# Altium schematic symbol library FPGA_Xilinx_Virtex6.SchLib: 28 symbols (part 1 of 21)
Pins are listed as number, name and electrical type; pins without a type are passive.

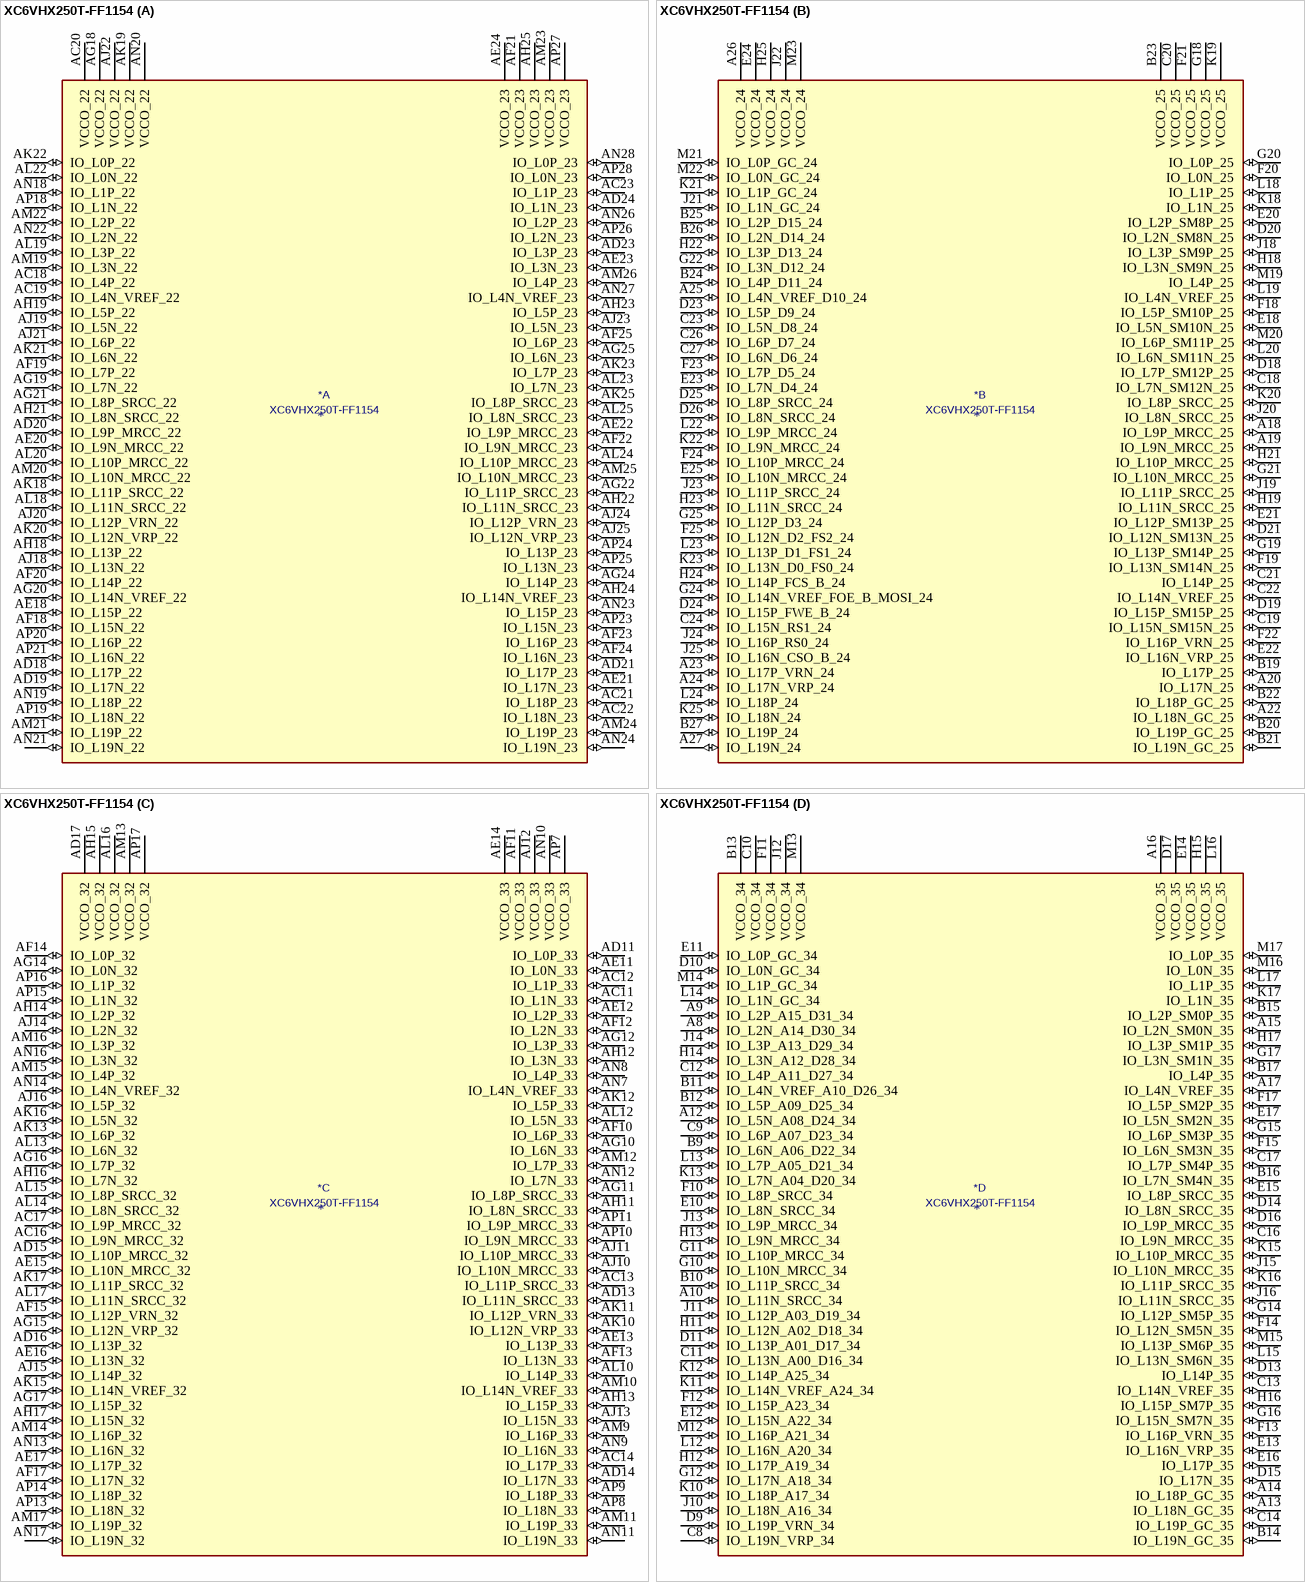
[diagram p0: symbol XC6VHX250T-FF1154]

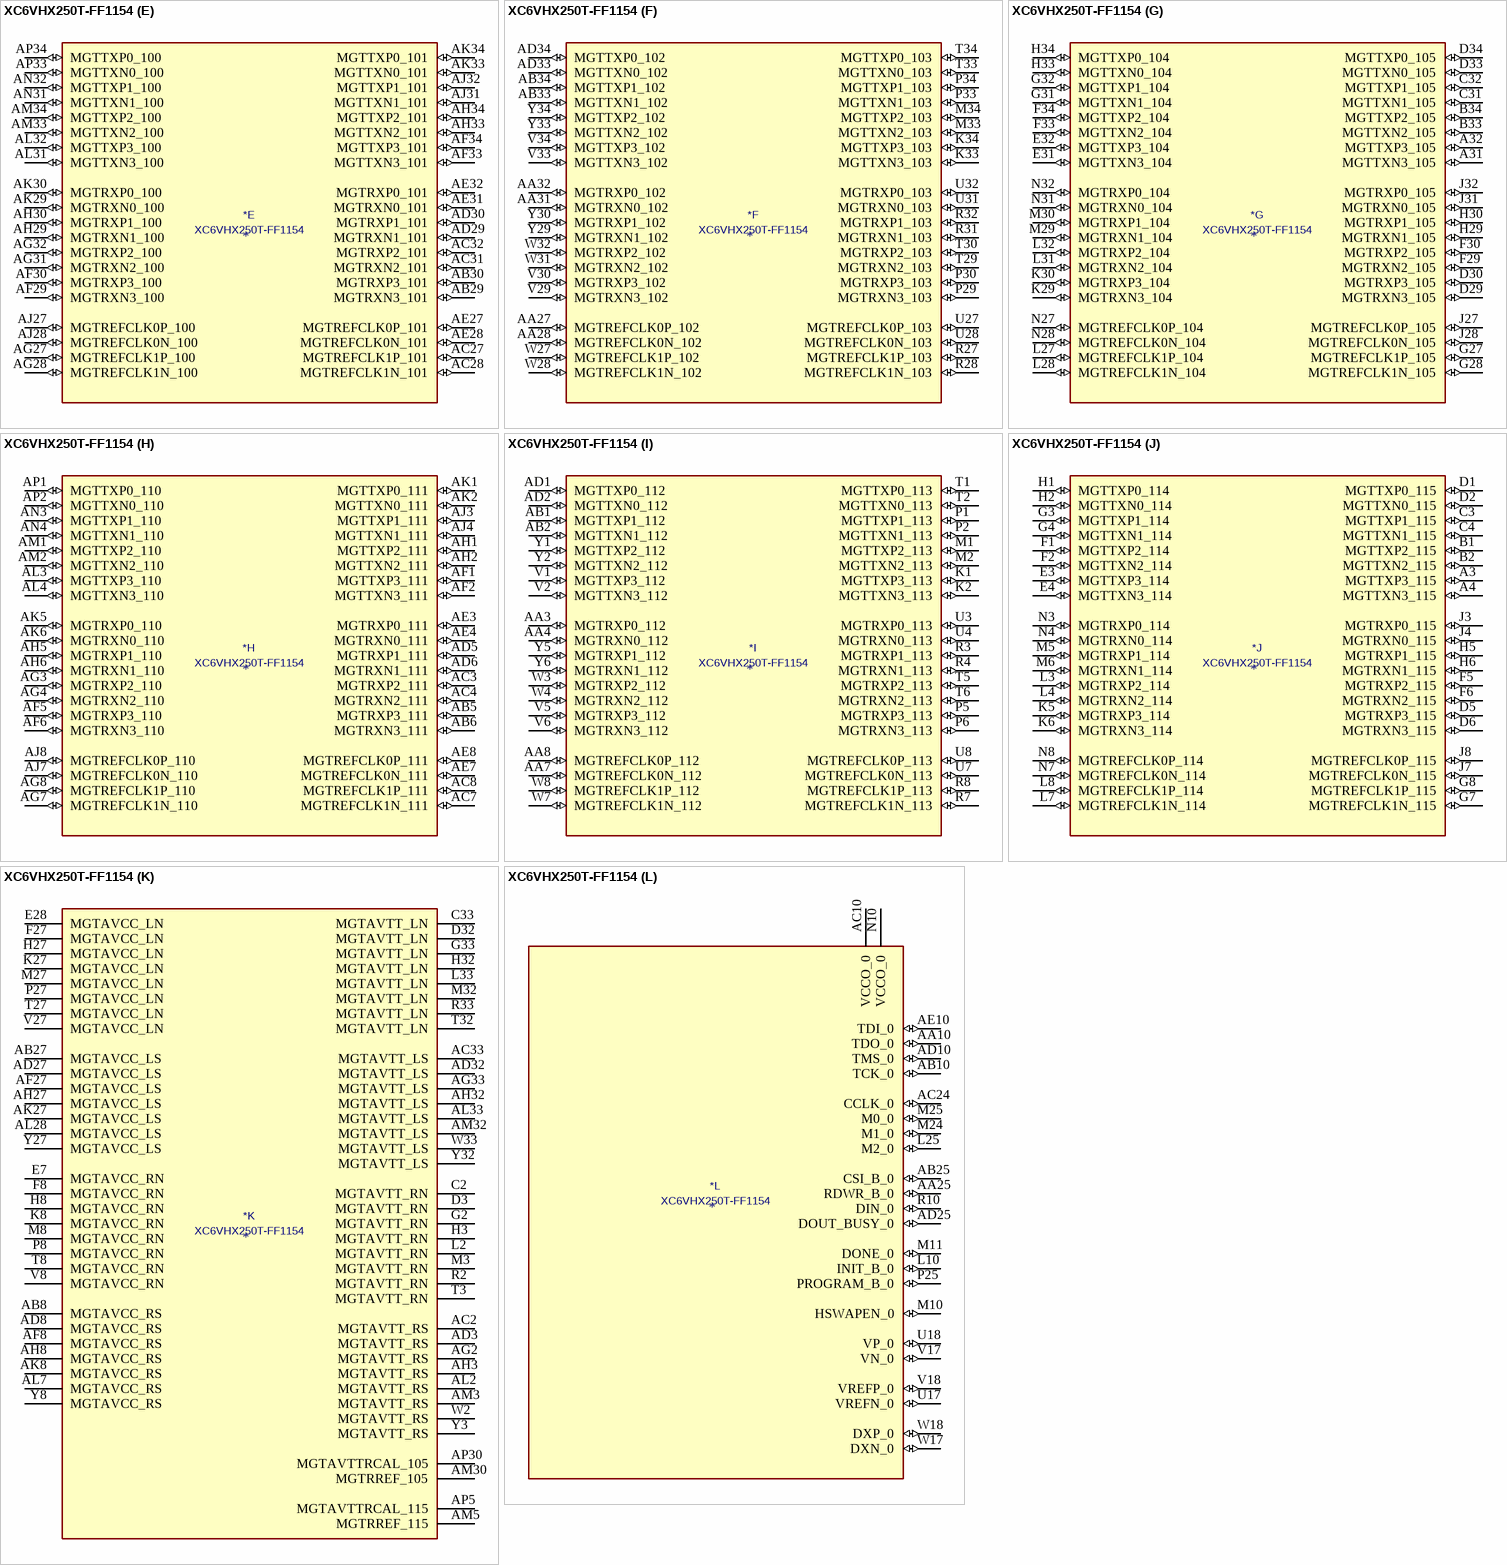
[diagram p1: symbol XC6VHX250T-FF1154]

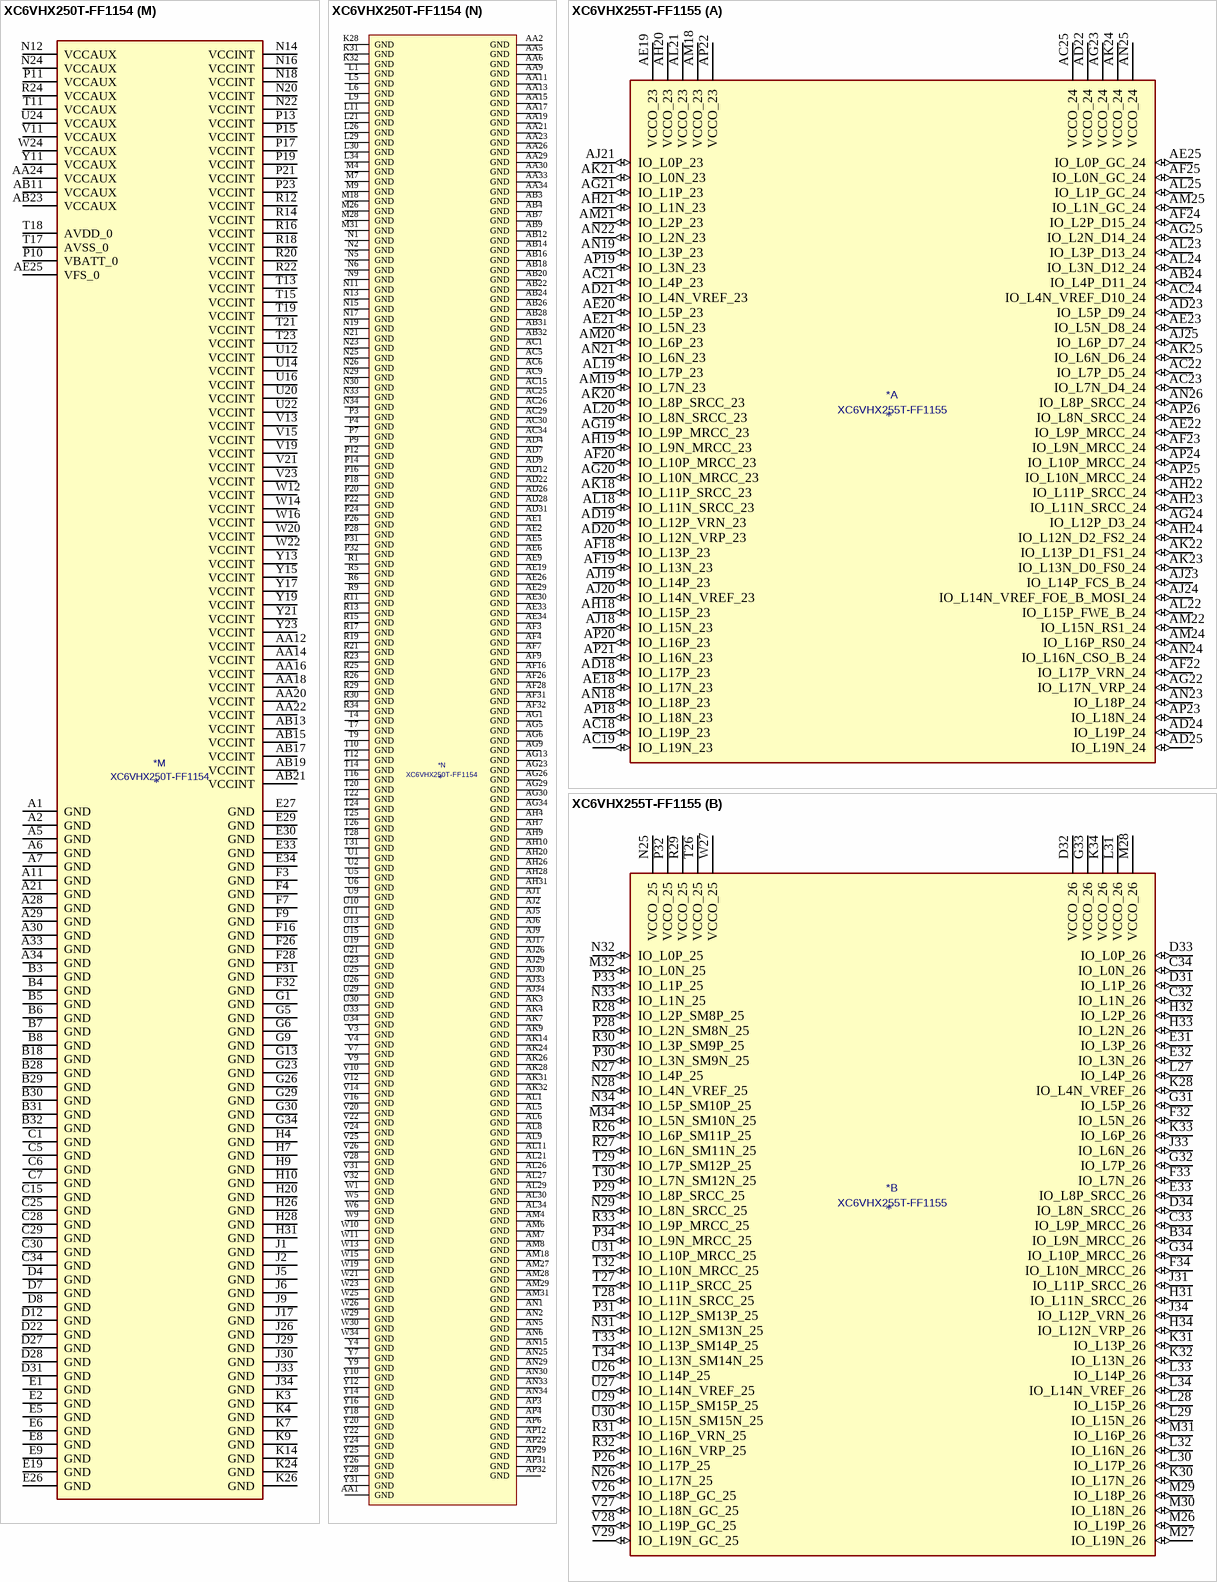
[diagram p2: symbols XC6VHX250T-FF1154 to XC6VHX255T-FF1155]

## XC6VHX250T-FF1154
designator *  value XC6VHX250T-FF1154
ki_keywords: FPGA; ki_description: Virtex 6 HXT 250 XC6VHX250T-FF1154
part A pins: AC18 IO_L4P_22 (io), AC19 IO_L4N_VREF_22 (io), AC20 VCCO_22 (power), AC21 IO_L18P_23 (io), AC22 IO_L18N_23 (io), AC23 IO_L1P_23 (io), AD18 IO_L17P_22 (io), AD19 IO_L17N_22 (io), AD20 IO_L9P_MRCC_22 (io), AD21 IO_L17P_23 (io), AD23 IO_L3P_23 (io), AD24 IO_L1N_23 (io), AE18 IO_L15P_22 (io), AE20 IO_L9N_MRCC_22 (io), AE21 IO_L17N_23 (io), AE22 IO_L9P_MRCC_23 (io), AE23 IO_L3N_23 (io), AE24 VCCO_23 (power), AF18 IO_L15N_22 (io), AF19 IO_L7P_22 (io), AF20 IO_L14P_22 (io), AF21 VCCO_23 (power), AF22 IO_L9N_MRCC_23 (io), AF23 IO_L16P_23 (io), AF24 IO_L16N_23 (io), AF25 IO_L6P_23 (io), AG18 VCCO_22 (power), AG19 IO_L7N_22 (io), AG20 IO_L14N_VREF_22 (io), AG21 IO_L8P_SRCC_22 (io), AG22 IO_L11P_SRCC_23 (io), AG24 IO_L14P_23 (io), AG25 IO_L6N_23 (io), AH18 IO_L13P_22 (io), AH19 IO_L5P_22 (io), AH21 IO_L8N_SRCC_22 (io), AH22 IO_L11N_SRCC_23 (io), AH23 IO_L5P_23 (io), AH24 IO_L14N_VREF_23 (io), AH25 VCCO_23 (power), AJ18 IO_L13N_22 (io), AJ19 IO_L5N_22 (io), AJ20 IO_L12P_VRN_22 (io), AJ21 IO_L6P_22 (io), AJ22 VCCO_22 (power), AJ23 IO_L5N_23 (io), AJ24 IO_L12P_VRN_23 (io), AJ25 IO_L12N_VRP_23 (io), AK18 IO_L11P_SRCC_22 (io), AK19 VCCO_22 (power), AK20 IO_L12N_VRP_22 (io), AK21 IO_L6N_22 (io), AK22 IO_L0P_22 (io), AK23 IO_L7P_23 (io), AK25 IO_L8P_SRCC_23 (io), AL18 IO_L11N_SRCC_22 (io), AL19 IO_L3P_22 (io), AL20 IO_L10P_MRCC_22 (io), AL22 IO_L0N_22 (io), AL23 IO_L7N_23 (io), AL24 IO_L10P_MRCC_23 (io), AL25 IO_L8N_SRCC_23 (io), AM19 IO_L3N_22 (io), AM20 IO_L10N_MRCC_22 (io), AM21 IO_L19P_22 (io), AM22 IO_L2P_22 (io), AM23 VCCO_23 (power), AM24 IO_L19P_23 (io), AM25 IO_L10N_MRCC_23 (io), AM26 IO_L4P_23 (io), AN18 IO_L1P_22 (io), AN19 IO_L18P_22 (io), AN20 VCCO_22 (power), AN21 IO_L19N_22 (io), AN22 IO_L2N_22 (io), AN23 IO_L15P_23 (io), AN24 IO_L19N_23 (io), AN26 IO_L2P_23 (io), AN27 IO_L4N_VREF_23 (io), AN28 IO_L0P_23 (io), AP18 IO_L1N_22 (io), AP19 IO_L18N_22 (io), AP20 IO_L16P_22 (io), AP21 IO_L16N_22 (io), AP23 IO_L15N_23 (io), AP24 IO_L13P_23 (io), AP25 IO_L13N_23 (io), AP26 IO_L2N_23 (io), AP27 VCCO_23 (power), AP28 IO_L0N_23 (io)
part B pins: A18 IO_L9P_MRCC_25 (io), A19 IO_L9N_MRCC_25 (io), A20 IO_L17N_25 (io), A22 IO_L18N_GC_25 (io), A23 IO_L17P_VRN_24 (io), A24 IO_L17N_VRP_24 (io), A25 IO_L4N_VREF_D10_24 (io), A26 VCCO_24 (power), A27 IO_L19N_24 (io), B19 IO_L17P_25 (io), B20 IO_L19P_GC_25 (io), B21 IO_L19N_GC_25 (io), B22 IO_L18P_GC_25 (io), B23 VCCO_25 (power), B24 IO_L4P_D11_24 (io), B25 IO_L2P_D15_24 (io), B26 IO_L2N_D14_24 (io), B27 IO_L19P_24 (io), C18 IO_L7N_SM12N_25 (io), C19 IO_L15N_SM15N_25 (io), C20 VCCO_25 (power), C21 IO_L14P_25 (io), C22 IO_L14N_VREF_25 (io), C23 IO_L5N_D8_24 (io), C24 IO_L15N_RS1_24 (io), C26 IO_L6P_D7_24 (io), C27 IO_L6N_D6_24 (io), D18 IO_L7P_SM12P_25 (io), D19 IO_L15P_SM15P_25 (io), D20 IO_L2N_SM8N_25 (io), D21 IO_L12N_SM13N_25 (io), D23 IO_L5P_D9_24 (io), D24 IO_L15P_FWE_B_24 (io), D25 IO_L8P_SRCC_24 (io), D26 IO_L8N_SRCC_24 (io), E18 IO_L5N_SM10N_25 (io), E20 IO_L2P_SM8P_25 (io), E21 IO_L12P_SM13P_25 (io), E22 IO_L16N_VRP_25 (io), E23 IO_L7N_D4_24 (io), E24 VCCO_24 (power), E25 IO_L10N_MRCC_24 (io), F18 IO_L5P_SM10P_25 (io), F19 IO_L13N_SM14N_25 (io), F20 IO_L0N_25 (io), F21 VCCO_25 (power), F22 IO_L16P_VRN_25 (io), F23 IO_L7P_D5_24 (io), F24 IO_L10P_MRCC_24 (io), F25 IO_L12N_D2_FS2_24 (io), G18 VCCO_25 (power), G19 IO_L13P_SM14P_25 (io), G20 IO_L0P_25 (io), G21 IO_L10N_MRCC_25 (io), G22 IO_L3N_D12_24 (io), G24 IO_L14N_VREF_FOE_B_MOSI_24 (io), G25 IO_L12P_D3_24 (io), H18 IO_L3N_SM9N_25 (io), H19 IO_L11N_SRCC_25 (io), H21 IO_L10P_MRCC_25 (io), H22 IO_L3P_D13_24 (io), H23 IO_L11N_SRCC_24 (io), H24 IO_L14P_FCS_B_24 (io), H25 VCCO_24 (power), J18 IO_L3P_SM9P_25 (io), J19 IO_L11P_SRCC_25 (io), J20 IO_L8N_SRCC_25 (io), J21 IO_L1N_GC_24 (io), J22 VCCO_24 (power), J23 IO_L11P_SRCC_24 (io), J24 IO_L16P_RS0_24 (io), J25 IO_L16N_CSO_B_24 (io), K18 IO_L1N_25 (io), K19 VCCO_25 (power), K20 IO_L8P_SRCC_25 (io), K21 IO_L1P_GC_24 (io), K22 IO_L9N_MRCC_24 (io), K23 IO_L13N_D0_FS0_24 (io), K25 IO_L18N_24 (io), L18 IO_L1P_25 (io), L19 IO_L4N_VREF_25 (io), L20 IO_L6N_SM11N_25 (io), L22 IO_L9P_MRCC_24 (io), L23 IO_L13P_D1_FS1_24 (io), L24 IO_L18P_24 (io), M19 IO_L4P_25 (io), M20 IO_L6P_SM11P_25 (io), M21 IO_L0P_GC_24 (io), M22 IO_L0N_GC_24 (io), M23 VCCO_24 (power)
part C pins: AC11 IO_L1N_33 (io), AC12 IO_L1P_33 (io), AC13 IO_L11P_SRCC_33 (io), AC14 IO_L17P_33 (io), AC16 IO_L9N_MRCC_32 (io), AC17 IO_L9P_MRCC_32 (io), AD11 IO_L0P_33 (io), AD13 IO_L11N_SRCC_33 (io), AD14 IO_L17N_33 (io), AD15 IO_L10P_MRCC_32 (io), AD16 IO_L13P_32 (io), AD17 VCCO_32 (power), AE11 IO_L0N_33 (io), AE12 IO_L2P_33 (io), AE13 IO_L13P_33 (io), AE14 VCCO_33 (power), AE15 IO_L10N_MRCC_32 (io), AE16 IO_L13N_32 (io), AE17 IO_L17P_32 (io), AF10 IO_L6P_33 (io), AF11 VCCO_33 (power), AF12 IO_L2N_33 (io), AF13 IO_L13N_33 (io), AF14 IO_L0P_32 (io), AF15 IO_L12P_VRN_32 (io), AF17 IO_L17N_32 (io), AG10 IO_L6N_33 (io), AG11 IO_L8P_SRCC_33 (io), AG12 IO_L3P_33 (io), AG14 IO_L0N_32 (io), AG15 IO_L12N_VRP_32 (io), AG16 IO_L7P_32 (io), AG17 IO_L15P_32 (io), AH11 IO_L8N_SRCC_33 (io), AH12 IO_L3N_33 (io), AH13 IO_L15P_33 (io), AH14 IO_L2P_32 (io), AH15 VCCO_32 (power), AH16 IO_L7N_32 (io), AH17 IO_L15N_32 (io), AJ10 IO_L10N_MRCC_33 (io), AJ11 IO_L10P_MRCC_33 (io), AJ12 VCCO_33 (power), AJ13 IO_L15N_33 (io), AJ14 IO_L2N_32 (io), AJ15 IO_L14P_32 (io), AJ16 IO_L5P_32 (io), AK10 IO_L12N_VRP_33 (io), AK11 IO_L12P_VRN_33 (io), AK12 IO_L5P_33 (io), AK13 IO_L6P_32 (io), AK15 IO_L14N_VREF_32 (io), AK16 IO_L5N_32 (io), AK17 IO_L11P_SRCC_32 (io), AL10 IO_L14P_33 (io), AL12 IO_L5N_33 (io), AL13 IO_L6N_32 (io), AL14 IO_L8N_SRCC_32 (io), AL15 IO_L8P_SRCC_32 (io), AL16 VCCO_32 (power), AL17 IO_L11N_SRCC_32 (io), AM9 IO_L16P_33 (io), AM10 IO_L14N_VREF_33 (io), AM11 IO_L19P_33 (io), AM12 IO_L7P_33 (io), AM13 VCCO_32 (power), AM14 IO_L16P_32 (io), AM15 IO_L4P_32 (io), AM16 IO_L3P_32 (io), AM17 IO_L19P_32 (io), AN7 IO_L4N_VREF_33 (io), AN8 IO_L4P_33 (io), AN9 IO_L16N_33 (io), AN10 VCCO_33 (power), AN11 IO_L19N_33 (io), AN12 IO_L7N_33 (io), AN13 IO_L16N_32 (io), AN14 IO_L4N_VREF_32 (io), AN16 IO_L3N_32 (io), AN17 IO_L19N_32 (io), AP7 VCCO_33 (power), AP8 IO_L18N_33 (io), AP9 IO_L18P_33 (io), AP10 IO_L9N_MRCC_33 (io), AP11 IO_L9P_MRCC_33 (io), AP13 IO_L18N_32 (io), AP14 IO_L18P_32 (io), AP15 IO_L1N_32 (io), AP16 IO_L1P_32 (io), AP17 VCCO_32 (power)
part D pins: A8 IO_L2N_A14_D30_34 (io), A9 IO_L2P_A15_D31_34 (io), A10 IO_L11N_SRCC_34 (io), A12 IO_L5N_A08_D24_34 (io), A13 IO_L18N_GC_35 (io), A14 IO_L18P_GC_35 (io), A15 IO_L2N_SM0N_35 (io), A16 VCCO_35 (power), A17 IO_L4N_VREF_35 (io), B9 IO_L6N_A06_D22_34 (io), B10 IO_L11P_SRCC_34 (io), B11 IO_L4N_VREF_A10_D26_34 (io), B12 IO_L5P_A09_D25_34 (io), B13 VCCO_34 (power), B14 IO_L19N_GC_35 (io), B15 IO_L2P_SM0P_35 (io), B16 IO_L7N_SM4N_35 (io), B17 IO_L4P_35 (io), C8 IO_L19N_VRP_34 (io), C9 IO_L6P_A07_D23_34 (io), C10 VCCO_34 (power), C11 IO_L13N_A00_D16_34 (io), C12 IO_L4P_A11_D27_34 (io), C13 IO_L14N_VREF_35 (io), C14 IO_L19P_GC_35 (io), C16 IO_L9N_MRCC_35 (io), C17 IO_L7P_SM4P_35 (io), D9 IO_L19P_VRN_34 (io), D10 IO_L0N_GC_34 (io), D11 IO_L13P_A01_D17_34 (io), D13 IO_L14P_35 (io), D14 IO_L8N_SRCC_35 (io), D15 IO_L17N_35 (io), D16 IO_L9P_MRCC_35 (io), D17 VCCO_35 (power), E10 IO_L8N_SRCC_34 (io), E11 IO_L0P_GC_34 (io), E12 IO_L15N_A22_34 (io), E13 IO_L16N_VRP_35 (io), E14 VCCO_35 (power), E15 IO_L8P_SRCC_35 (io), E16 IO_L17P_35 (io), E17 IO_L5N_SM2N_35 (io), F10 IO_L8P_SRCC_34 (io), F11 VCCO_34 (power), F12 IO_L15P_A23_34 (io), F13 IO_L16P_VRN_35 (io), F14 IO_L12N_SM5N_35 (io), F15 IO_L6N_SM3N_35 (io), F17 IO_L5P_SM2P_35 (io), G10 IO_L10N_MRCC_34 (io), G11 IO_L10P_MRCC_34 (io), G12 IO_L17N_A18_34 (io), G14 IO_L12P_SM5P_35 (io), G15 IO_L6P_SM3P_35 (io), G16 IO_L15N_SM7N_35 (io), G17 IO_L3N_SM1N_35 (io), H11 IO_L12N_A02_D18_34 (io), H12 IO_L17P_A19_34 (io), H13 IO_L9N_MRCC_34 (io), H14 IO_L3N_A12_D28_34 (io), H15 VCCO_35 (power), H16 IO_L15P_SM7P_35 (io), H17 IO_L3P_SM1P_35 (io), J10 IO_L18N_A16_34 (io), J11 IO_L12P_A03_D19_34 (io), J12 VCCO_34 (power), J13 IO_L9P_MRCC_34 (io), J14 IO_L3P_A13_D29_34 (io), J15 IO_L10N_MRCC_35 (io), J16 IO_L11N_SRCC_35 (io), K10 IO_L18P_A17_34 (io), K11 IO_L14N_VREF_A24_34 (io), K12 IO_L14P_A25_34 (io), K13 IO_L7N_A04_D20_34 (io), K15 IO_L10P_MRCC_35 (io), K16 IO_L11P_SRCC_35 (io), K17 IO_L1N_35 (io), L12 IO_L16N_A20_34 (io), L13 IO_L7P_A05_D21_34 (io), L14 IO_L1N_GC_34 (io), L15 IO_L13N_SM6N_35 (io), L16 VCCO_35 (power), L17 IO_L1P_35 (io), M12 IO_L16P_A21_34 (io), M13 VCCO_34 (power), M14 IO_L1P_GC_34 (io), M15 IO_L13P_SM6P_35 (io), M16 IO_L0N_35 (io), M17 IO_L0P_35 (io)
part E pins: AB29 MGTRXN3_101 (io), AB30 MGTRXP3_101 (io), AC27 MGTREFCLK1P_101 (io), AC28 MGTREFCLK1N_101 (io), AC31 MGTRXN2_101 (io), AC32 MGTRXP2_101 (io), AD29 MGTRXN1_101 (io), AD30 MGTRXP1_101 (io), AE27 MGTREFCLK0P_101 (io), AE28 MGTREFCLK0N_101 (io), AE31 MGTRXN0_101 (io), AE32 MGTRXP0_101 (io), AF29 MGTRXN3_100 (io), AF30 MGTRXP3_100 (io), AF33 MGTTXN3_101 (io), AF34 MGTTXP3_101 (io), AG27 MGTREFCLK1P_100 (io), AG28 MGTREFCLK1N_100 (io), AG31 MGTRXN2_100 (io), AG32 MGTRXP2_100 (io), AH29 MGTRXN1_100 (io), AH30 MGTRXP1_100 (io), AH33 MGTTXN2_101 (io), AH34 MGTTXP2_101 (io), AJ27 MGTREFCLK0P_100 (io), AJ28 MGTREFCLK0N_100 (io), AJ31 MGTTXN1_101 (io), AJ32 MGTTXP1_101 (io), AK29 MGTRXN0_100 (io), AK30 MGTRXP0_100 (io), AK33 MGTTXN0_101 (io), AK34 MGTTXP0_101 (io), AL31 MGTTXN3_100 (io), AL32 MGTTXP3_100 (io), AM33 MGTTXN2_100 (io), AM34 MGTTXP2_100 (io), AN31 MGTTXN1_100 (io), AN32 MGTTXP1_100 (io), AP33 MGTTXN0_100 (io), AP34 MGTTXP0_100 (io)
part F pins: AA27 MGTREFCLK0P_102 (io), AA28 MGTREFCLK0N_102 (io), AA31 MGTRXN0_102 (io), AA32 MGTRXP0_102 (io), AB33 MGTTXN1_102 (io), AB34 MGTTXP1_102 (io), AD33 MGTTXN0_102 (io), AD34 MGTTXP0_102 (io), K33 MGTTXN3_103 (io), K34 MGTTXP3_103 (io), M33 MGTTXN2_103 (io), M34 MGTTXP2_103 (io), P29 MGTRXN3_103 (io), P30 MGTRXP3_103 (io), P33 MGTTXN1_103 (io), P34 MGTTXP1_103 (io), R27 MGTREFCLK1P_103 (io), R28 MGTREFCLK1N_103 (io), R31 MGTRXN1_103 (io), R32 MGTRXP1_103 (io), T29 MGTRXN2_103 (io), T30 MGTRXP2_103 (io), T33 MGTTXN0_103 (io), T34 MGTTXP0_103 (io), U27 MGTREFCLK0P_103 (io), U28 MGTREFCLK0N_103 (io), U31 MGTRXN0_103 (io), U32 MGTRXP0_103 (io), V29 MGTRXN3_102 (io), V30 MGTRXP3_102 (io), V33 MGTTXN3_102 (io), V34 MGTTXP3_102 (io), W27 MGTREFCLK1P_102 (io), W28 MGTREFCLK1N_102 (io), W31 MGTRXN2_102 (io), W32 MGTRXP2_102 (io), Y29 MGTRXN1_102 (io), Y30 MGTRXP1_102 (io), Y33 MGTTXN2_102 (io), Y34 MGTTXP2_102 (io)
part G pins: A31 MGTTXN3_105 (io), A32 MGTTXP3_105 (io), B33 MGTTXN2_105 (io), B34 MGTTXP2_105 (io), C31 MGTTXN1_105 (io), C32 MGTTXP1_105 (io), D29 MGTRXN3_105 (io), D30 MGTRXP3_105 (io), D33 MGTTXN0_105 (io), D34 MGTTXP0_105 (io), E31 MGTTXN3_104 (io), E32 MGTTXP3_104 (io), F29 MGTRXN2_105 (io), F30 MGTRXP2_105 (io), F33 MGTTXN2_104 (io), F34 MGTTXP2_104 (io), G27 MGTREFCLK1P_105 (io), G28 MGTREFCLK1N_105 (io), G31 MGTTXN1_104 (io), G32 MGTTXP1_104 (io), H29 MGTRXN1_105 (io), H30 MGTRXP1_105 (io), H33 MGTTXN0_104 (io), H34 MGTTXP0_104 (io), J27 MGTREFCLK0P_105 (io), J28 MGTREFCLK0N_105 (io), J31 MGTRXN0_105 (io), J32 MGTRXP0_105 (io), K29 MGTRXN3_104 (io), K30 MGTRXP3_104 (io), L27 MGTREFCLK1P_104 (io), L28 MGTREFCLK1N_104 (io), L31 MGTRXN2_104 (io), L32 MGTRXP2_104 (io), M29 MGTRXN1_104 (io), M30 MGTRXP1_104 (io), N27 MGTREFCLK0P_104 (io), N28 MGTREFCLK0N_104 (io), N31 MGTRXN0_104 (io), N32 MGTRXP0_104 (io)
part H pins: AB5 MGTRXP3_111 (io), AB6 MGTRXN3_111 (io), AC3 MGTRXP2_111 (io), AC4 MGTRXN2_111 (io), AC7 MGTREFCLK1N_111 (io), AC8 MGTREFCLK1P_111 (io), AD5 MGTRXP1_111 (io), AD6 MGTRXN1_111 (io), AE3 MGTRXP0_111 (io), AE4 MGTRXN0_111 (io), AE7 MGTREFCLK0N_111 (io), AE8 MGTREFCLK0P_111 (io), AF1 MGTTXP3_111 (io), AF2 MGTTXN3_111 (io), AF5 MGTRXP3_110 (io), AF6 MGTRXN3_110 (io), AG3 MGTRXP2_110 (io), AG4 MGTRXN2_110 (io), AG7 MGTREFCLK1N_110 (io), AG8 MGTREFCLK1P_110 (io), AH1 MGTTXP2_111 (io), AH2 MGTTXN2_111 (io), AH5 MGTRXP1_110 (io), AH6 MGTRXN1_110 (io), AJ3 MGTTXP1_111 (io), AJ4 MGTTXN1_111 (io), AJ7 MGTREFCLK0N_110 (io), AJ8 MGTREFCLK0P_110 (io), AK1 MGTTXP0_111 (io), AK2 MGTTXN0_111 (io), AK5 MGTRXP0_110 (io), AK6 MGTRXN0_110 (io), AL3 MGTTXP3_110 (io), AL4 MGTTXN3_110 (io), AM1 MGTTXP2_110 (io), AM2 MGTTXN2_110 (io), AN3 MGTTXP1_110 (io), AN4 MGTTXN1_110 (io), AP1 MGTTXP0_110 (io), AP2 MGTTXN0_110 (io)
part I pins: AA3 MGTRXP0_112 (io), AA4 MGTRXN0_112 (io), AA7 MGTREFCLK0N_112 (io), AA8 MGTREFCLK0P_112 (io), AB1 MGTTXP1_112 (io), AB2 MGTTXN1_112 (io), AD1 MGTTXP0_112 (io), AD2 MGTTXN0_112 (io), K1 MGTTXP3_113 (io), K2 MGTTXN3_113 (io), M1 MGTTXP2_113 (io), M2 MGTTXN2_113 (io), P1 MGTTXP1_113 (io), P2 MGTTXN1_113 (io), P5 MGTRXP3_113 (io), P6 MGTRXN3_113 (io), R3 MGTRXP1_113 (io), R4 MGTRXN1_113 (io), R7 MGTREFCLK1N_113 (io), R8 MGTREFCLK1P_113 (io), T1 MGTTXP0_113 (io), T2 MGTTXN0_113 (io), T5 MGTRXP2_113 (io), T6 MGTRXN2_113 (io), U3 MGTRXP0_113 (io), U4 MGTRXN0_113 (io), U7 MGTREFCLK0N_113 (io), U8 MGTREFCLK0P_113 (io), V1 MGTTXP3_112 (io), V2 MGTTXN3_112 (io), V5 MGTRXP3_112 (io), V6 MGTRXN3_112 (io), W3 MGTRXP2_112 (io), W4 MGTRXN2_112 (io), W7 MGTREFCLK1N_112 (io), W8 MGTREFCLK1P_112 (io), Y1 MGTTXP2_112 (io), Y2 MGTTXN2_112 (io), Y5 MGTRXP1_112 (io), Y6 MGTRXN1_112 (io)
part J pins: A3 MGTTXP3_115 (io), A4 MGTTXN3_115 (io), B1 MGTTXP2_115 (io), B2 MGTTXN2_115 (io), C3 MGTTXP1_115 (io), C4 MGTTXN1_115 (io), D1 MGTTXP0_115 (io), D2 MGTTXN0_115 (io), D5 MGTRXP3_115 (io), D6 MGTRXN3_115 (io), E3 MGTTXP3_114 (io), E4 MGTTXN3_114 (io), F1 MGTTXP2_114 (io), F2 MGTTXN2_114 (io), F5 MGTRXP2_115 (io), F6 MGTRXN2_115 (io), G3 MGTTXP1_114 (io), G4 MGTTXN1_114 (io), G7 MGTREFCLK1N_115 (io), G8 MGTREFCLK1P_115 (io), H1 MGTTXP0_114 (io), H2 MGTTXN0_114 (io), H5 MGTRXP1_115 (io), H6 MGTRXN1_115 (io), J3 MGTRXP0_115 (io), J4 MGTRXN0_115 (io), J7 MGTREFCLK0N_115 (io), J8 MGTREFCLK0P_115 (io), K5 MGTRXP3_114 (io), K6 MGTRXN3_114 (io), L3 MGTRXP2_114 (io), L4 MGTRXN2_114 (io), L7 MGTREFCLK1N_114 (io), L8 MGTREFCLK1P_114 (io), M5 MGTRXP1_114 (io), M6 MGTRXN1_114 (io), N3 MGTRXP0_114 (io), N4 MGTRXN0_114 (io), N7 MGTREFCLK0N_114 (io), N8 MGTREFCLK0P_114 (io)
part K pins: AB8 MGTAVCC_RS (power), AB27 MGTAVCC_LS (power), AC2 MGTAVTT_RS (power), AC33 MGTAVTT_LS (power), AD3 MGTAVTT_RS (power), AD8 MGTAVCC_RS (power), AD27 MGTAVCC_LS (power), AD32 MGTAVTT_LS (power), AF8 MGTAVCC_RS (power), AF27 MGTAVCC_LS (power), AG2 MGTAVTT_RS (power), AG33 MGTAVTT_LS (power), AH3 MGTAVTT_RS (power), AH8 MGTAVCC_RS (power), AH27 MGTAVCC_LS (power), AH32 MGTAVTT_LS (power), AK8 MGTAVCC_RS (power), AK27 MGTAVCC_LS (power), AL2 MGTAVTT_RS (power), AL7 MGTAVCC_RS (power), AL28 MGTAVCC_LS (power), AL33 MGTAVTT_LS (power), AM3 MGTAVTT_RS (power), AM5 MGTRREF_115 (power), AM30 MGTRREF_105 (power), AM32 MGTAVTT_LS (power), AP5 MGTAVTTRCAL_115 (power), AP30 MGTAVTTRCAL_105 (power), C2 MGTAVTT_RN (power), C33 MGTAVTT_LN (power), D3 MGTAVTT_RN (power), D32 MGTAVTT_LN (power), E7 MGTAVCC_RN (power), E28 MGTAVCC_LN (power), F8 MGTAVCC_RN (power), F27 MGTAVCC_LN (power), G2 MGTAVTT_RN (power), G33 MGTAVTT_LN (power), H3 MGTAVTT_RN (power), H8 MGTAVCC_RN (power), H27 MGTAVCC_LN (power), H32 MGTAVTT_LN (power), K8 MGTAVCC_RN (power), K27 MGTAVCC_LN (power), L2 MGTAVTT_RN (power), L33 MGTAVTT_LN (power), M3 MGTAVTT_RN (power), M8 MGTAVCC_RN (power), M27 MGTAVCC_LN (power), M32 MGTAVTT_LN (power), P8 MGTAVCC_RN (power), P27 MGTAVCC_LN (power), R2 MGTAVTT_RN (power), R33 MGTAVTT_LN (power), T3 MGTAVTT_RN (power), T8 MGTAVCC_RN (power), T27 MGTAVCC_LN (power), T32 MGTAVTT_LN (power), V8 MGTAVCC_RN (power), V27 MGTAVCC_LN (power), W2 MGTAVTT_RS (power), W33 MGTAVTT_LS (power), Y3 MGTAVTT_RS (power), Y8 MGTAVCC_RS (power), Y27 MGTAVCC_LS (power), Y32 MGTAVTT_LS (power)
part L pins: AA10 TDO_0 (io), AA25 RDWR_B_0 (io), AB10 TCK_0 (io), AB25 CSI_B_0 (io), AC10 VCCO_0 (power), AC24 CCLK_0 (io), AD10 TMS_0 (io), AD25 DOUT_BUSY_0 (io), AE10 TDI_0 (io), L10 INIT_B_0 (io), L25 M2_0 (io), M10 HSWAPEN_0 (io), M11 DONE_0 (io), M24 M1_0 (io), M25 M0_0 (io), N10 VCCO_0 (power), P25 PROGRAM_B_0 (io), R10 DIN_0 (io), U17 VREFN_0 (io), U18 VP_0 (io), V17 VN_0 (io), V18 VREFP_0 (io), W17 DXN_0 (io), W18 DXP_0 (io)
part M pins: A1 GND (power), A2 GND (power), A5 GND (power), A6 GND (power), A7 GND (power), A11 GND (power), A21 GND (power), A28 GND (power), A29 GND (power), A30 GND (power), A33 GND (power), A34 GND (power), AA12 VCCINT (power), AA14 VCCINT (power), AA16 VCCINT (power), AA18 VCCINT (power), AA20 VCCINT (power), AA22 VCCINT (power), AA24 VCCAUX (power), AB11 VCCAUX (power), AB13 VCCINT (power), AB15 VCCINT (power), AB17 VCCINT (power), AB19 VCCINT (power), AB21 VCCINT (power), AB23 VCCAUX (power), AE25 VFS_0 (power), B3 GND (power), B4 GND (power), B5 GND (power), B6 GND (power), B7 GND (power), B8 GND (power), B18 GND (power), B28 GND (power), B29 GND (power), B30 GND (power), B31 GND (power), B32 GND (power), C1 GND (power), C5 GND (power), C6 GND (power), C7 GND (power), C15 GND (power), C25 GND (power), C28 GND (power), C29 GND (power), C30 GND (power), C34 GND (power), D4 GND (power), D7 GND (power), D8 GND (power), D12 GND (power), D22 GND (power), D27 GND (power), D28 GND (power), D31 GND (power), E1 GND (power), E2 GND (power), E5 GND (power), E6 GND (power), E8 GND (power), E9 GND (power), E19 GND (power), E26 GND (power), E27 GND (power), E29 GND (power), E30 GND (power), E33 GND (power), E34 GND (power), F3 GND (power), F4 GND (power), F7 GND (power), F9 GND (power), F16 GND (power), F26 GND (power), F28 GND (power), F31 GND (power), F32 GND (power), G1 GND (power), G5 GND (power), G6 GND (power), G9 GND (power), G13 GND (power), G23 GND (power), G26 GND (power), G29 GND (power), G30 GND (power), G34 GND (power), H4 GND (power), H7 GND (power), H9 GND (power), H10 GND (power), H20 GND (power), H26 GND (power), H28 GND (power), H31 GND (power), J1 GND (power), J2 GND (power), J5 GND (power), J6 GND (power), J9 GND (power), J17 GND (power), J26 GND (power), J29 GND (power), J30 GND (power), J33 GND (power), J34 GND (power), K3 GND (power), K4 GND (power), K7 GND (power), K9 GND (power), K14 GND (power), K24 GND (power), K26 GND (power), N12 VCCAUX (power), N14 VCCINT (power), N16 VCCINT (power), N18 VCCINT (power), N20 VCCINT (power), N22 VCCINT (power), N24 VCCAUX (power), P10 VBATT_0 (power), P11 VCCAUX (power), P13 VCCINT (power), P15 VCCINT (power), P17 VCCINT (power), P19 VCCINT (power), P21 VCCINT (power), P23 VCCINT (power), R12 VCCINT (power), R14 VCCINT (power), R16 VCCINT (power), R18 VCCINT (power), R20 VCCINT (power), R22 VCCINT (power), R24 VCCAUX (power), T11 VCCAUX (power), T13 VCCINT (power), T15 VCCINT (power), T17 AVSS_0 (power), T18 AVDD_0 (power), T19 VCCINT (power), T21 VCCINT (power), T23 VCCINT (power), U12 VCCINT (power), U14 VCCINT (power), U16 VCCINT (power), U20 VCCINT (power), U22 VCCINT (power), U24 VCCAUX (power), V11 VCCAUX (power), V13 VCCINT (power), V15 VCCINT (power), V19 VCCINT (power), V21 VCCINT (power), V23 VCCINT (power), W12 VCCINT (power), W14 VCCINT (power), W16 VCCINT (power), W20 VCCINT (power), W22 VCCINT (power), W24 VCCAUX (power), Y11 VCCAUX (power), Y13 VCCINT (power), Y15 VCCINT (power), Y17 VCCINT (power), Y19 VCCINT (power), Y21 VCCINT (power), Y23 VCCINT (power)